# Altium footprint library mastermind.PCBLIB: 1061 footprints (part 23 of 67)
Each footprint in its own frame and in the unit in brackets; x right, y up, seen from the top. Pads: shape width x height; smd on the part's side, far side on the other; paste and mask are expansions set on the pad; w line width, h text height; cw(c..) or ccw(c..) is an arc to the next point about the centre after c.
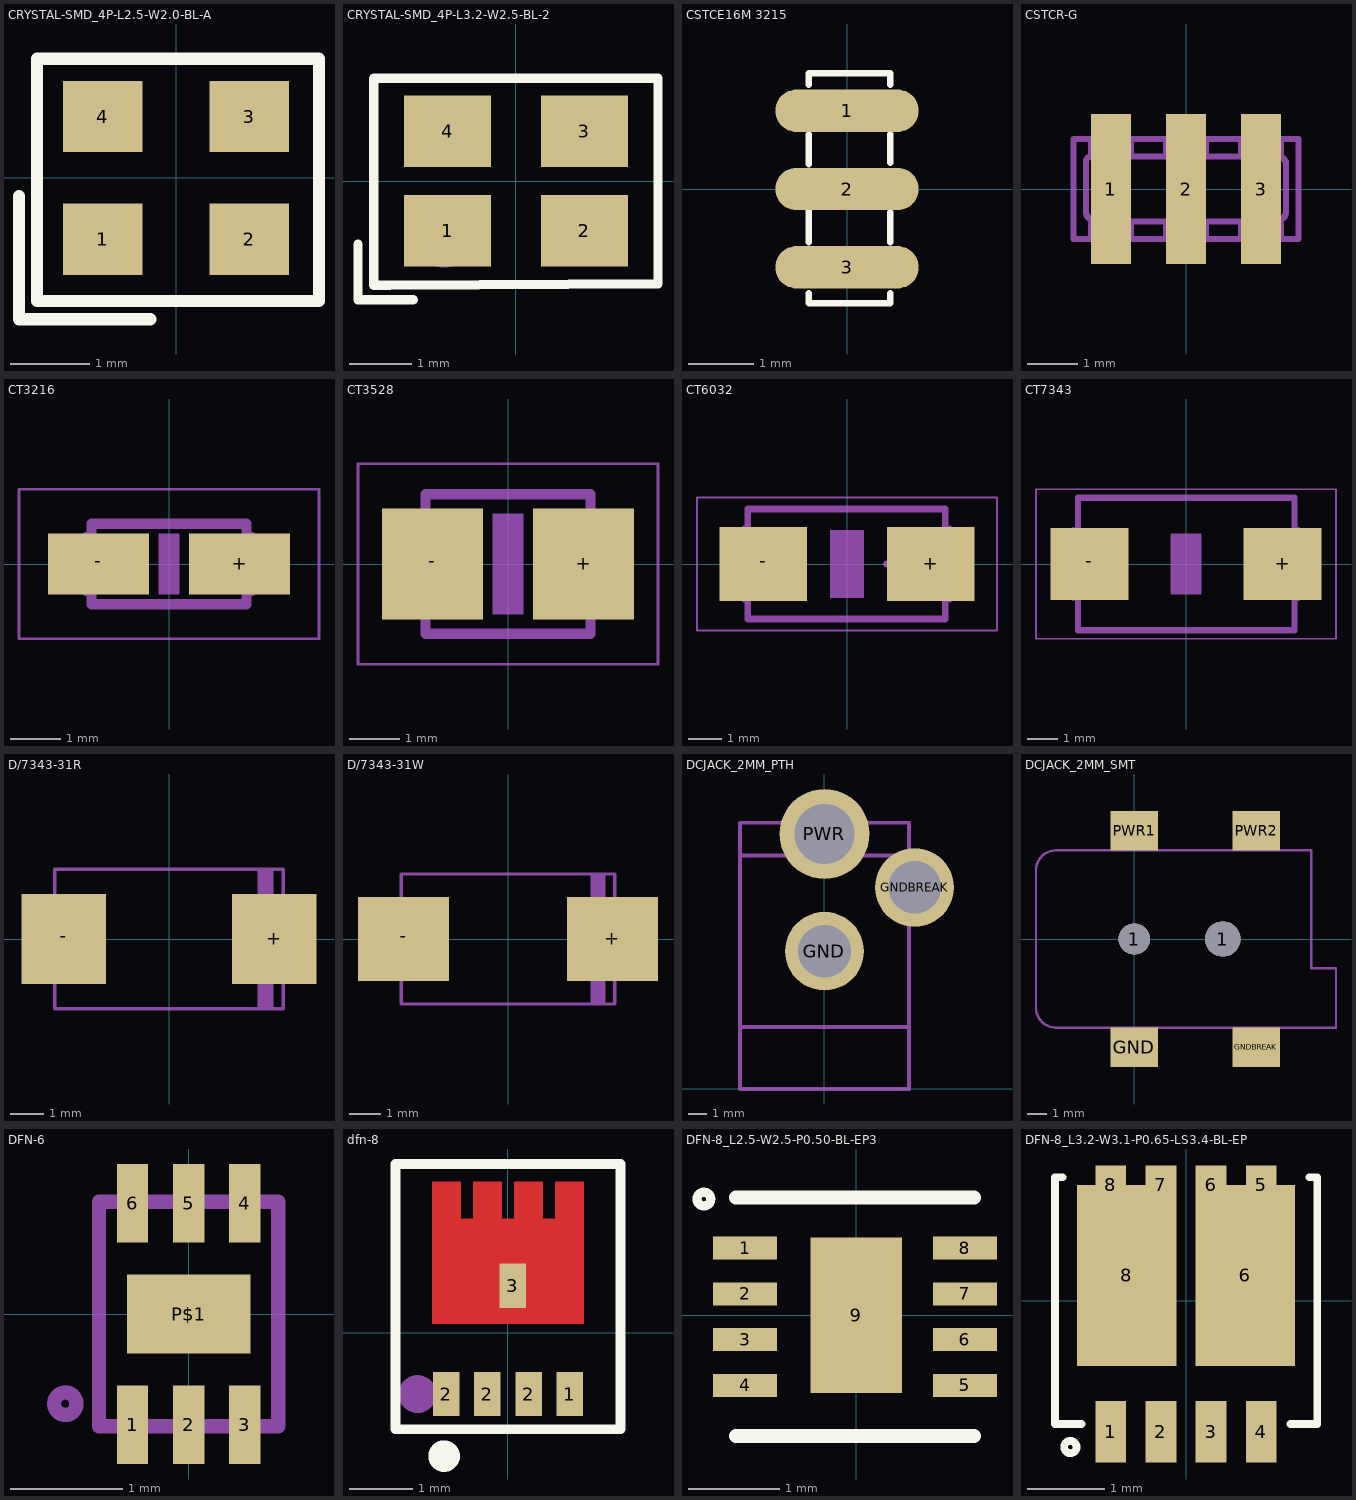
[diagram p22: the footprints below, top view; thin cyan lines are the x and y axes]

## CRYSTAL-SMD_4P-L2.5-W2.0-BL-A [mm]
pads (4):
  rect 1x0.9 smd: 1(-0.925,-0.775) 2(0.925,-0.775) 3(0.925,0.775) 4(-0.925,0.775)
Top Overlay:
  lines w0.152: -1.982,-0.226 -1.982,-1.783 -0.326,-1.783 ; -1.754,-1.554 1.804,-1.554 1.804,1.504 -1.754,1.504 -1.754,-1.554
Mechanical 15:
  circle w0.3: c-0.981,-0.733 r0.15
3D body "2520 SMD Crystal Oscillator.STEP": height 0.65, standoff -0.05, extent -1.25,-1 1.25,1

## CRYSTAL-SMD_4P-L3.2-W2.5-BL-2 [mm]
pads (4):
  rect 1.4x1.15 smd: 1(-1.1,-0.8) 2(1.1,-0.8) 3(1.1,0.8) 4(-1.1,0.8)
Top Overlay:
  lines w0.152: -2.54,-1.016 -2.54,-1.778 -2.54,-1.905 -1.651,-1.905 ; -2.286,-1.679 -2.286,1.651 2.286,1.651 2.286,0 2.286,-1.651 -2.03,-1.679 -2.286,-1.679
Mechanical 15:
  circle w0.5: c-1.143,-0.889 r0.25

## CSTCE16M 3215 [mm]
pads (3):
  oval 2.2x0.65 smd: 1(0,1.2) 2(0,0) 3(0,-1.2)
Top Overlay:
  lines w0.1: -0.584,-1.6 -0.584,-1.751 0.66,-1.751 0.66,-1.6 ; -0.584,-0.813 -0.584,-0.33 ; -0.584,0.381 -0.584,0.838 ; -0.584,1.6 -0.584,1.777 0.66,1.777 0.66,1.6 ; 0.66,-0.813 0.66,-0.356 ; 0.66,0.406 0.66,0.838
3D body "cstce v4.f3d.__gcx3d__.stp": height 0.9, standoff 0, extent -0.584,-1.6 0.716,1.6

## CSTCR-G [mm]
pads (3):
  rect 0.8x3 smd: 1(-1.5,0) 2(0,0) 3(1.5,0)
Mechanical 2:
  lines w0.127: -1.9,-0.95 -1.9,-0.7 ; -1.9,0.7 -1.9,1 ; -1.1,-0.95 -1.1,-0.7 ; -0.4,-0.95 -0.4,-0.65 ; -0.4,0.7 -0.4,1 ; 0.4,-0.95 0.4,-0.7 ; 0.4,0.7 0.4,1 ; 1.1,-0.95 1.1,-0.7 ; 1.1,0.7 1.1,1 ; 1.9,-0.95 1.9,-0.7 ; 1.9,0.7 1.9,1 ; -1.9,1 -2.25,1 -2.25,-1 -1.7,-1 cw(c-1.5,-1) -1.3,-1 -0.2,-1 cw(c0,-1) 0.2,-1 1.3,-1 cw(c1.5,-1) 1.7,-1 2.25,-1 2.25,1 1.9,1 ; -1.9,1 -1.7,1 ccw(c-1.5,1) -1.3,1 -1.1,1 ; -1.1,0.65 1.85,0.65 cw(c1.85,0.5) 2,0.5 2,-0.45 cw(c1.8,-0.45) 1.8,-0.65 -0.4,-0.65 ; -1.1,0.65 -1.9,0.65 ccw(c-1.9,0.55) -2,0.55 -2,-0.45 ccw(c-1.8,-0.45) -1.8,-0.65 -0.4,-0.65 ; -1.1,0.65 -1.1,1 ; -1.1,1 -0.4,1 ; -0.4,1 -0.2,1 ccw(c0,1) 0.2,1 0.4,1 ; 0.4,1 1.1,1 ; 1.1,1 1.3,1 ccw(c1.5,1) 1.7,1 1.9,1

## CT3216 [mm]
pads (2):
  rect 2x1.2 smd: +(1.4,0) -(-1.4,0)
Mechanical 2:
  lines w0.203: -1.535,-0.798 1.535,-0.798 ; -1.535,0.798 1.535,0.798
Mechanical 8:
  lines w0.152: -1.651,-0.559 -1.651,0.559 ; 1.651,-0.559 1.651,0.559
  lines w0.203: -1.535,-0.798 -1.535,0.798 ; 0.7,0 1.26,0 ; 0.97,-0.26 0.97,0.3 ; 1.535,-0.798 1.535,0.798
Mechanical 30:
  region: -0.2,-0.6 -0.2,0.6 0.2,0.6 0.2,-0.6
Mechanical 29 (Mech34):
  lines w0.051: -2.973,-1.483 2.973,-1.483 2.973,1.483 -2.973,1.483 -2.973,-1.483

## CT3528 [mm]
pads (2):
  rect 2x2.2 smd: +(1.5,0) -(-1.5,0)
Mechanical 2:
  lines w0.203: -1.637,-1.383 1.637,-1.383 ; -1.637,1.383 1.637,1.383
Mechanical 8:
  lines w0.152: -1.778,-1.016 -1.778,1.016 ; 1.778,-1.016 1.778,1.016
  lines w0.203: -1.637,-1.383 -1.637,1.383 ; 0.68,0 1.31,0 ; 1,-0.3 1,0.33 ; 1.637,-1.383 1.637,1.383
Mechanical 30:
  region: -0.3,-1 -0.3,1 0.3,1 0.3,-1
Mechanical 29 (Mech34):
  lines w0.051: -2.973,-1.983 -2.973,1.983 2.973,1.983 2.973,-1.983 -2.973,-1.983

## CT6032 [mm]
pads (2):
  rect 2.6x2.2 smd: +(2.5,0) -(-2.5,0)
Mechanical 2:
  lines w0.203: -2.957,-1.637 2.932,-1.637 ; -2.957,1.637 2.932,1.637
Mechanical 8:
  lines w0.152: -3.073,-1.067 -3.073,1.067 ; 3.073,-1.067 3.073,1.067
  lines w0.203: -2.957,-1.637 -2.957,1.637 ; 1.18,0 2.45,0 ; 1.8,-0.63 1.8,0.64 ; 2.932,-1.637 2.932,1.637
Mechanical 30:
  region: -0.5,-1 -0.5,1 0.5,1 0.5,-1
Mechanical 29 (Mech34):
  lines w0.051: -4.473,-1.983 4.473,-1.983 4.473,1.983 -4.473,1.983 -4.473,-1.983

## CT7343 [mm]
pads (2):
  rect 2.6x2.4 smd: +(3.2,0) -(-3.2,0)
Mechanical 2:
  lines w0.203: -3.582,-1.615 -3.582,-2.195 3.592,-2.195 3.592,-1.615 ; -3.582,1.615 -3.582,2.195 3.592,2.195 3.592,1.615
Mechanical 8:
  lines w0.152: -3.734,-1.143 -3.734,1.143 ; 3.734,-1.143 3.734,1.143
  lines w0.203: -3.582,-2.195 -3.582,2.195 ; 2.04,0 3.09,0 ; 2.55,-0.52 2.55,0.52 ; 3.592,-2.195 3.592,2.195
Mechanical 30:
  region: -0.5,-1 -0.5,1 0.5,1 0.5,-1
Mechanical 29 (Mech34):
  lines w0.051: -4.973,-2.483 -4.973,2.483 4.973,2.483 4.973,-2.483 -4.973,-2.483

## D/7343-31R [mm]
pads (2):
  rect 2.55x2.7 smd: +(3.175,0) -(-3.175,0)
Mechanical 8:
  region: 2.675,-2.125 2.675,2.125 3.15,2.125 3.15,-2.125
  region: 3.5,-1.2 3.5,1.2 3.65,1.2 3.65,-1.2
  region: -3.65,-1.2 -3.65,1.2 -3.5,1.2 -3.5,-1.2
  lines w0.102: -3.45,-2.1 -3.45,2.1 3.45,2.1 3.45,-2.1 -3.45,-2.1

## D/7343-31W [mm]
pads (2):
  rect 2.95x2.7 smd: +(3.375,0) -(-3.375,0)
Mechanical 8:
  region: 2.675,-2.125 2.675,2.125 3.15,2.125 3.15,-2.125
  region: 3.5,-1.2 3.5,1.2 3.65,1.2 3.65,-1.2
  region: -3.65,-1.2 -3.65,1.2 -3.5,1.2 -3.5,-1.2
  lines w0.102: -3.45,-2.1 -3.45,2.1 3.45,2.1 3.45,-2.1 -3.45,-2.1

## DCJACK_2MM_PTH [mm]
pads (3):
  round 4.2 hole 2.8: GND(0,7.35) GNDBREAK(4.8,10.75)
  round 4.8 hole 3.2: PWR(0,13.6)
Mechanical 2:
  lines w0.203: -2.6,14.2 -4.5,14.2 -4.5,3.3 4.5,3.3 4.5,8.4 ; 2.4,14.2 4.5,14.2 4.5,13.1
Mechanical 8:
  lines w0.203: 2.4,14.2 2.65,14.2 ; 4.4,12.45 -4.5,12.45 ; 4.5,8.4 4.5,8.35 ; -4.5,3.3 -4.5,0 4.5,0 4.5,3.3 ; -4.5,3.3 4.5,3.3 ; -4.5,3.3 -4.5,12.45 ; -4.5,12.45 -4.5,14.2 2.65,14.2 ; 2.65,14.2 4.5,14.2 4.5,8.35 ; 4.5,3.3 4.5,8.35

## DCJACK_2MM_SMT [mm]
pads (6):
  round 1.6 hole 1.6: 1(0,0)
  round 1.8 hole 1.8: 1(4.5,0)
  rect 2.4x2 smd: GND(0,-5.5) GNDBREAK(6.2,-5.5) PWR1(0,5.5) PWR2(6.2,5.5)
Top Layer keep-out:
  region: 0,0 0.254,0 0.254,0.254 0,0.254
  region: 0,0 0.254,0 0.254,0.254 0,0.254
  region: 0,0 0.254,0 0.254,0.254 0,0.254
  region: 0,0 0.254,0 0.254,0.254 0,0.254
Mechanical 2:
  lines w0.127: -1.684,-4.5 -4,-4.5 cw(c-4,-3.5) -5,-3.5 -5,3.5 cw(c-4,3.5) -4,4.5 -1.668,4.5 ; 1.588,-4.5 4.666,-4.5 ; 1.588,4.5 4.682,4.5 ; 7.938,-4.5 10.254,-4.5 10.254,-1.492 9,-1.492 9,4.5 7.938,4.5
Mechanical 8:
  lines w0.127: -5,-3.5 ccw(c-4,-3.5) -4,-4.5 10.254,-4.5 10.254,-1.492 9,-1.492 9,4.5 -4,4.5 ccw(c-4,3.5) -5,3.5 -5,-3.5

## DFN-6 [mm]
pads (7):
  rect 0.28x0.7 smd: 1(-0.5,-0.988) 2(0,-0.988) 3(0.5,-0.988) 4(0.5,0.988) 5(0,0.988) 6(-0.5,0.988)
  rect 1.1x0.7 smd paste-0.55: P$1(0,0)
Top Paste:
  region: -0.15,0.1 -0.15,0.35 0.15,0.35 0.15,0.1
  region: 0.15,-0.1 0.15,-0.35 -0.15,-0.35 -0.15,-0.1
  region: -0.3,-0.35 -0.55,-0.35 -0.55,-0.1 -0.3,-0.1
  region: 0.55,-0.1 0.55,-0.35 0.3,-0.35 0.3,-0.1
  region: 0.3,0.35 0.55,0.35 0.55,0.1 0.3,0.1
  region: -0.55,0.1 -0.55,0.35 -0.3,0.35 -0.3,0.1
Mechanical 2:
  circle w0.127: c-1.1,-0.8 r0.1
  lines w0.127: -0.8,-1 -0.8,1 0.8,1 0.8,-1 -0.8,-1

## dfn-8 [mm]
pads (5):
  rect 0.42x0.7 smd: 1(0.975,-0.97) 2(-0.975,-0.97) 2(-0.325,-0.97) 2(0.325,-0.97) 3(0.076,0.742)
Top Layer:
  region: -1.2,0.14 -1.2,2.39 -0.75,2.39 -0.75,1.8 -0.55,1.8 -0.55,2.39 -0.1,2.39 -0.1,1.8 0.1,1.8 0.1,2.39 0.55,2.39 0.55,1.8 0.75,1.8 0.75,2.39 1.2,2.39 1.2,0.14
Top Overlay:
  circle w0.25: c-1.01,-1.95 r0.125
  lines w0.152: -1.778,-1.524 1.778,-1.524 1.778,2.667 -1.778,2.667 -1.778,-1.524
Top Paste:
  region: -1.19,-0.62 -0.76,-0.62 -0.76,-1.32 -1.19,-1.32
  region: -0.54,-0.62 -0.11,-0.62 -0.11,-1.32 -0.54,-1.32
  region: 0.11,-0.62 0.54,-0.62 0.54,-1.32 0.11,-1.32
  region: 0.76,-0.62 1.19,-0.62 1.19,-1.32 0.76,-1.32
  region: 1.2,2.39 1.2,0.14 -1.2,0.14 -1.2,2.39 -0.75,2.39 -0.75,1.8 -0.55,1.8 -0.55,2.39 -0.1,2.39 -0.1,1.8 0.1,1.8 0.1,2.39 0.55,2.39 0.55,1.8 0.75,1.8 0.75,2.39
  region: -1.2,0.14 -1.2,2.39 -0.75,2.39 -0.75,1.8 -0.55,1.8 -0.55,2.39 -0.1,2.39 -0.1,1.8 0.1,1.8 0.1,2.39 0.55,2.39 0.55,1.8 0.75,1.8 0.75,2.39 1.2,2.39 1.2,0.14
Top Solder:
  region: -1.2,0.14 -1.2,2.39 -0.75,2.39 -0.75,1.8 -0.55,1.8 -0.55,2.39 -0.1,2.39 -0.1,1.8 0.1,1.8 0.1,2.39 0.55,2.39 0.55,1.8 0.75,1.8 0.75,2.39 1.2,2.39 1.2,0.14
Mechanical 2:
  text "dfn-8" at -0.046,-4.646 h1.52
Mechanical 15:
  circle w0.3: c-1.43,-0.97 r0.15
3D body: height 0.7, standoff 0, extent -1.43,-0.97 1.47,2.095

## DFN-8_L2.5-W2.5-P0.50-BL-EP3 [mm] "HUMIDITY, TEMPERATURE ANALOG VOLTAGE 0 ~ 100% RH ±3% RH DFN_8 TEMPERATURE & HUMIDITY SENSORS ROHS"
pads (9):
  rect 0.7x0.25 smd mask+0.12: 1(-1.213,0.735) 2(-1.213,0.235) 3(-1.213,-0.265) 4(-1.213,-0.765) 5(1.187,-0.765) 6(1.187,-0.265) 7(1.187,0.235) 8(1.187,0.735)
  rect 1x1.7 smd: 9(0,0)
Top Overlay:
  circle w0.1: c-1.664,1.27 r0.075
  lines w0.152: -1.313,-1.315 1.287,-1.315 ; -1.313,1.285 1.287,1.285
Mechanical 15:
  lines w0.003: 0.299,0.01 0.35,-0.04

## DFN-8_L3.2-W3.1-P0.65-LS3.4-BL-EP [mm]
pads (10):
  rect 0.4x0.8 smd: 1(-0.975,-1.7) 2(-0.325,-1.7) 3(0.325,-1.7) 4(0.975,-1.7)
  rect 0.4x0.5 smd: 5(0.975,1.5) 6(0.325,1.5) 7(-0.325,1.5) 8(-0.975,1.5)
  rect 1.29x2.35 smd: 6(0.77,0.325) 8(-0.77,0.325)
Top Overlay:
  circle w0.1: c-1.5,-1.9 r0.08
  lines w0.1: -1.6,1.6 -1.7,1.6 -1.7,-1.6 -1.355,-1.6 ; 1.355,-1.6 1.7,-1.6 1.7,1.6 1.6,1.6
Top Paste:
  region: -1.18,-1.2 -0.77,-1.2 -0.77,-1.8 -1.18,-1.8
  region: -0.53,-1.2 -0.12,-1.2 -0.12,-1.8 -0.53,-1.8
  region: 0.12,-1.2 0.53,-1.2 0.53,-1.8 0.12,-1.8
  region: 0.77,-1.2 1.18,-1.2 1.18,-1.8 0.77,-1.8
  region: -1.18,1.75 -0.77,1.75 -0.77,1.48 -1.18,1.48
  region: -0.53,1.75 -0.12,1.75 -0.12,1.48 -0.53,1.48
  region: 0.12,1.75 0.53,1.75 0.53,1.48 0.12,1.48
  region: 0.77,1.75 1.18,1.75 1.18,1.48 0.77,1.48
  region: -1.41,1.31 -0.13,1.31 -0.13,-0.85 -1.42,-0.85 -1.42,1.31
  region: 0.13,1.31 1.41,1.31 1.41,-0.85 0.12,-0.85 0.12,1.31
3D body: height 1, standoff 0, extent -1.7,-1.6 1.7,1.6
3D body: height 1, standoff 0, extent -1.381,-1.286 -1.106,-1.009